# Altium footprint library PCB SMD.PcbLib: 79 footprints (part 3 of 5)
Each footprint in its own frame and in the unit in brackets; x right, y up, seen from the top. Pads: shape width x height; smd on the part's side, far side on the other; paste and mask are expansions set on the pad; w line width, h text height; cw(c..) or ccw(c..) is an arc to the next point about the centre after c.
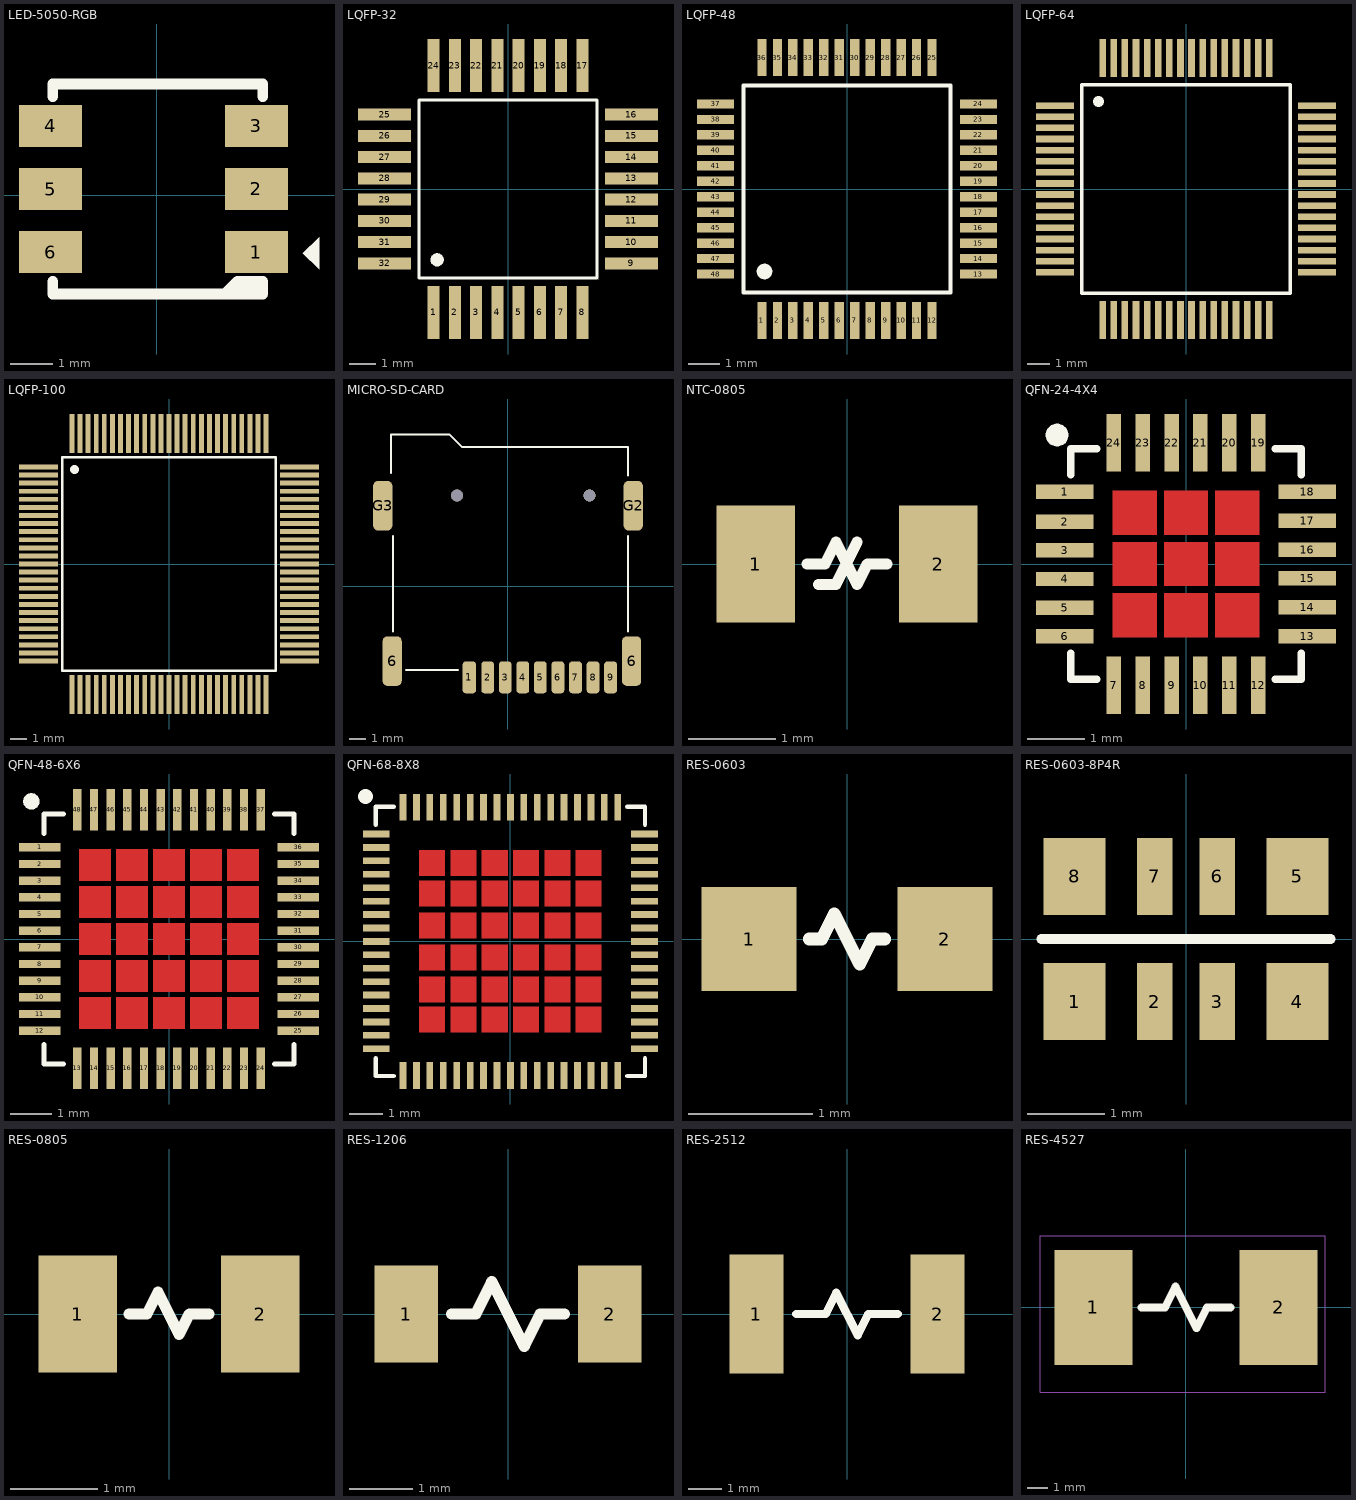
[diagram p2: the footprints below, top view; thin cyan lines are the x and y axes]

## LED-5050-RGB [mm]
pads (6):
  rect 1.5x1 smd: 1(2.374,-1.348) 2(2.374,0.152) 3(2.374,1.652) 4(-2.526,1.652) 5(-2.526,0.152) 6(-2.526,-1.348)
Top Overlay:
  region: 3.48,-1.372 3.861,-0.991 3.861,-1.753
  lines w0.254: -2.476,-2.048 -2.476,-2.348 2.524,-2.348 2.524,-2.048 ; -2.476,2.352 -2.476,2.652 2.524,2.652 2.524,2.352 ; 1.624,-2.348 1.924,-2.048 2.524,-2.048 ; 2.524,-2.048 2.224,-2.048 1.924,-2.348 2.224,-2.348 2.524,-2.048
3D body "User Library-smd_led_5050.STEP": height 1.6, standoff 0, extent -2.582,-2.348 2.718,2.652

## LQFP-32 [mm]
pads (33):
  rect 0.45x2 smd: 1(-2.8,-4.65) 2(-2,-4.65) 3(-1.2,-4.65) 4(-0.4,-4.65) 5(0.4,-4.65) 6(1.2,-4.65) 7(2,-4.65) 8(2.8,-4.65) 17(2.8,4.65) 18(2,4.65) 19(1.2,4.65) 20(0.4,4.65) 21(-0.4,4.65) 22(-1.2,4.65) 23(-2,4.65) 24(-2.8,4.65)
  rect 2x0.45 smd: 9(4.65,-2.8) 10(4.65,-2) 11(4.65,-1.2) 12(4.65,-0.4) 13(4.65,0.4) 14(4.65,1.2) 15(4.65,2) 16(4.65,2.8) 25(-4.65,2.8) 26(-4.65,2) 27(-4.65,1.2) 28(-4.65,0.4) 29(-4.65,-0.4) 30(-4.65,-1.2) 31(-4.65,-2) 32(-4.65,-2.8)
  round 0.508 on Top Overlay: ""(-2.671,-2.668)
Top Overlay:
  lines w0.127: 3.353,-3.353 3.353,3.353 -3.353,3.353 -3.353,-3.353 3.353,-3.353 ; 3.353,-3.353 3.353,-3.353
3D body "User Library-lqfp32-1.step": height 1.5, standoff 0.02, extent -4.5,-4.5 4.5,4.5

## LQFP-48 [mm] "for STM8S105C6T6"
pads (49):
  rect 0.3x1.2 smd: 1(-2.75,-4.25) 2(-2.25,-4.25) 3(-1.75,-4.25) 4(-1.25,-4.25) 5(-0.75,-4.25) 6(-0.25,-4.25) 7(0.25,-4.25) 8(0.75,-4.25) 9(1.25,-4.25) 10(1.75,-4.25) 11(2.25,-4.25) 12(2.75,-4.25) 25(2.75,4.25) 26(2.25,4.25) 27(1.75,4.25) 28(1.25,4.25) 29(0.75,4.25) 30(0.25,4.25) 31(-0.25,4.25) 32(-0.75,4.25) 33(-1.25,4.25) 34(-1.75,4.25) 35(-2.25,4.25) 36(-2.75,4.25)
  rect 1.2x0.3 smd: 13(4.25,-2.75) 14(4.25,-2.25) 15(4.25,-1.75) 16(4.25,-1.25) 17(4.25,-0.75) 18(4.25,-0.25) 19(4.25,0.25) 20(4.25,0.75) 21(4.25,1.25) 22(4.25,1.75) 23(4.25,2.25) 24(4.25,2.75) 37(-4.25,2.75) 38(-4.25,2.25) 39(-4.25,1.75) 40(-4.25,1.25) 41(-4.25,0.75) 42(-4.25,0.25) 43(-4.25,-0.25) 44(-4.25,-0.75) 45(-4.25,-1.25) 46(-4.25,-1.75) 47(-4.25,-2.25) 48(-4.25,-2.75)
  round 0.508 on Top Overlay: ""(-2.667,-2.667)
Top Overlay:
  lines w0.127: -3.353,-3.353 -3.353,3.353 3.353,3.353 3.353,-3.353 -3.353,-3.353
3D body "User Library-LQFP48-2.STEP": height 1.62, standoff -0.01, extent -4.572,-4.622 4.572,4.521

## LQFP-64 [mm]
pads (65):
  rect 1.7x0.3 smd: 1(-5.9,3.75) 2(-5.9,3.25) 3(-5.9,2.75) 4(-5.9,2.25) 5(-5.9,1.75) 6(-5.9,1.25) 7(-5.9,0.75) 8(-5.9,0.25) 9(-5.9,-0.25) 10(-5.9,-0.75) 11(-5.9,-1.25) 12(-5.9,-1.75) 13(-5.9,-2.25) 14(-5.9,-2.75) 15(-5.9,-3.25) 16(-5.9,-3.75) 33(5.9,-3.75) 34(5.9,-3.25) 35(5.9,-2.75) 36(5.9,-2.25) 37(5.9,-1.75) 38(5.9,-1.25) 39(5.9,-0.75) 40(5.9,-0.25) 41(5.9,0.25) 42(5.9,0.75) 43(5.9,1.25) 44(5.9,1.75) 45(5.9,2.25) 46(5.9,2.75) 47(5.9,3.25) 48(5.9,3.75)
  rect 0.3x1.7 smd: 17(-3.75,-5.9) 18(-3.25,-5.9) 19(-2.75,-5.9) 20(-2.25,-5.9) 21(-1.75,-5.9) 22(-1.25,-5.9) 23(-0.75,-5.9) 24(-0.25,-5.9) 25(0.25,-5.9) 26(0.75,-5.9) 27(1.25,-5.9) 28(1.75,-5.9) 29(2.25,-5.9) 30(2.75,-5.9) 31(3.25,-5.9) 32(3.75,-5.9) 49(3.75,5.9) 50(3.25,5.9) 51(2.75,5.9) 52(2.25,5.9) 53(1.75,5.9) 54(1.25,5.9) 55(0.75,5.9) 56(0.25,5.9) 57(-0.25,5.9) 58(-0.75,5.9) 59(-1.25,5.9) 60(-1.75,5.9) 61(-2.25,5.9) 62(-2.75,5.9) 63(-3.25,5.9) 64(-3.75,5.9)
  round 0.508 on Top Overlay: ""(-3.937,3.937)
Top Overlay:
  lines w0.152: -4.699,-4.699 -4.699,4.699 4.699,4.699 4.699,-4.699 -4.699,-4.699
3D body "User Library-LQFP64-1.STEP": height 1.56, standoff 0, extent -6,-6 6,6

## LQFP-100 [mm]
pads (101):
  rect 2.4x0.3 smd: 1(-8.075,6) 2(-8.075,5.5) 3(-8.075,5) 4(-8.075,4.5) 5(-8.075,4) 6(-8.075,3.5) 7(-8.075,3) 8(-8.075,2.5) 9(-8.075,2) 10(-8.075,1.5) 11(-8.075,1) 12(-8.075,0.5) 13(-8.075,0) 14(-8.075,-0.5) 15(-8.075,-1) 16(-8.075,-1.5) 17(-8.075,-2) 18(-8.075,-2.5) 19(-8.075,-3) 20(-8.075,-3.5) 21(-8.075,-4) 22(-8.075,-4.5) 23(-8.075,-5) 24(-8.075,-5.5) 25(-8.075,-6) 51(8.075,-6) 52(8.075,-5.5) 53(8.075,-5) 54(8.075,-4.5) 55(8.075,-4) 56(8.075,-3.5) 57(8.075,-3) 58(8.075,-2.5) 59(8.075,-2) 60(8.075,-1.5) 61(8.075,-1) 62(8.075,-0.5) 63(8.075,0) 64(8.075,0.5) 65(8.075,1) 66(8.075,1.5) 67(8.075,2) 68(8.075,2.5) 69(8.075,3) 70(8.075,3.5) 71(8.075,4) 72(8.075,4.5) 73(8.075,5) 74(8.075,5.5) 75(8.075,6)
  rect 0.3x2.4 smd: 26(-6,-8.075) 27(-5.5,-8.075) 28(-5,-8.075) 29(-4.5,-8.075) 30(-4,-8.075) 31(-3.5,-8.075) 32(-3,-8.075) 33(-2.5,-8.075) 34(-2,-8.075) 35(-1.5,-8.075) 36(-1,-8.075) 37(-0.5,-8.075) 38(0,-8.075) 39(0.5,-8.075) 40(1,-8.075) 41(1.5,-8.075) 42(2,-8.075) 43(2.5,-8.075) 44(3,-8.075) 45(3.5,-8.075) 46(4,-8.075) 47(4.5,-8.075) 48(5,-8.075) 49(5.5,-8.075) 50(6,-8.075) 76(6,8.075) 77(5.5,8.075) 78(5,8.075) 79(4.5,8.075) 80(4,8.075) 81(3.5,8.075) 82(3,8.075) 83(2.5,8.075) 84(2,8.075) 85(1.5,8.075) 86(1,8.075) 87(0.5,8.075) 88(0,8.075) 89(-0.5,8.075) 90(-1,8.075) 91(-1.5,8.075) 92(-2,8.075) 93(-2.5,8.075) 94(-3,8.075) 95(-3.5,8.075) 96(-4,8.075) 97(-4.5,8.075) 98(-5,8.075) 99(-5.5,8.075) 100(-6,8.075)
  round 0.559 on Top Overlay: ""(-5.842,5.842)
Top Overlay:
  lines w0.152: -6.604,-6.604 6.604,-6.604 6.604,6.604 -6.604,6.604 -6.604,-6.604
3D body "User Library-LQFP100-3.STEP": height 1.62, standoff -0.01, extent -8.072,-8.076 8.071,8.067

## MICRO-SD-CARD [mm]
pads (13):
  rrect50% 0.85x2 smd: 1(-2.423,-5.694)
  rrect50% 0.8x2 smd: 2(-1.273,-5.694) 3(-0.173,-5.694) 4(0.927,-5.694) 5(2.027,-5.694) 6(3.127,-5.694) 7(4.227,-5.694) 8(5.327,-5.694) 9(6.427,-5.694)
  rrect50% 1.2x3.1 smd: 6(-7.254,-4.679) 6(7.746,-4.679) G2(7.846,5.059) G3(-7.846,5.059)
via 5.108,5.694 diameter 0.762 hole 0.762
via -3.204,5.694 diameter 0.762 hole 0.762
Top Overlay:
  lines w0.127: -7.338,7.091 -7.338,9.504 -3.782,9.504 -3.655,9.504 -2.893,8.742 7.521,8.742 7.521,6.964 ; -7.211,-2.815 -7.211,3.154 ; -6.38,-5.228 -3.147,-5.228 ; 7.521,-2.815 7.521,3.154
3D body "User Library-MEM2055-00-190-01-A_revG.step": height 1.94, standoff -0.51, extent -8.161,-5.648 7.839,9.602

## NTC-0805 [mm]
pads (2):
  rect 0.9x1.35 smd: 1(-1.05,0) 2(1.05,0)
Top Overlay:
  lines w0.127: -0.457,0 -0.254,0 -0.127,0.254 0.117,-0.234 0.235,0.002 ; -0.33,-0.234 -0.127,-0.234 0.117,0.254 ; 0.239,0 0.457,0
3D body "RESC0805 v1.step": height 0.45, standoff 0, extent -1,-0.6 1,0.6

## QFN-24-4X4 [mm]
pads (25):
  rect 1x0.25 smd: 1(-2.1,1.25) 2(-2.1,0.73) 3(-2.1,0.235) 4(-2.1,-0.26) 5(-2.1,-0.755) 6(-2.1,-1.25) 13(2.1,-1.25) 14(2.1,-0.75) 15(2.1,-0.25) 16(2.1,0.25) 17(2.1,0.75) 18(2.1,1.25)
  rect 0.25x1 smd: 7(-1.25,-2.1) 8(-0.75,-2.1) 9(-0.25,-2.1) 10(0.25,-2.1) 11(0.75,-2.1) 12(1.25,-2.1) 19(1.25,2.1) 20(0.75,2.1) 21(0.25,2.1) 22(-0.25,2.1) 23(-0.75,2.1) 24(-1.25,2.1)
  round 0.4 on Top Overlay: ""(-2.235,2.235)
Top Layer:
  region: -1.27,1.27 -0.508,1.27 -0.508,0.508 -1.27,0.508
  region: -0.381,1.27 0.381,1.27 0.381,0.508 -0.381,0.508
  region: 0.508,1.27 1.27,1.27 1.27,0.508 0.508,0.508
  region: 0.508,0.381 1.27,0.381 1.27,-0.381 0.508,-0.381
  region: -0.381,0.381 0.381,0.381 0.381,-0.381 -0.381,-0.381
  region: -1.27,0.381 -0.508,0.381 -0.508,-0.381 -1.27,-0.381
  region: -1.27,-0.508 -0.508,-0.508 -0.508,-1.27 -1.27,-1.27
  region: -0.381,-0.508 0.381,-0.508 0.381,-1.27 -0.381,-1.27
  region: 0.508,-0.508 1.27,-0.508 1.27,-1.27 0.508,-1.27
Top Overlay:
  lines w0.127: -2,-1.549 -2,-2 -1.549,-2 ; -2,1.549 -2,2 -1.549,2 ; 1.549,-2 2,-2 2,-1.549 ; 1.549,2 2,2 2,1.549
Top Solder:
  region: -1.397,1.397 1.397,1.397 1.397,-1.397 -1.397,-1.397
3D body "User Library-QFN24.STEP": height 0.9, standoff 0, extent -2.005,-2.005 2.005,2.005

## QFN-48-6X6 [mm]
pads (49):
  rect 1x0.203 smd: 1(-3.1,2.2) 2(-3.1,1.8) 3(-3.1,1.4) 4(-3.1,1) 5(-3.1,0.6) 6(-3.1,0.2) 7(-3.1,-0.2) 8(-3.1,-0.6) 9(-3.1,-1) 10(-3.1,-1.4) 11(-3.1,-1.8) 12(-3.1,-2.2) 25(3.1,-2.2) 26(3.1,-1.8) 27(3.1,-1.4) 28(3.1,-1) 29(3.1,-0.6) 30(3.1,-0.2) 31(3.1,0.2) 32(3.1,0.6) 33(3.1,1) 34(3.1,1.4) 35(3.1,1.8) 36(3.1,2.2)
  rect 0.203x1 smd: 13(-2.2,-3.1) 14(-1.8,-3.1) 15(-1.4,-3.1) 16(-1,-3.1) 17(-0.6,-3.1) 18(-0.2,-3.1) 19(0.2,-3.1) 20(0.6,-3.1) 21(1,-3.1) 22(1.4,-3.1) 23(1.8,-3.1) 24(2.2,-3.1) 37(2.2,3.1) 38(1.8,3.1) 39(1.4,3.1) 40(1,3.1) 41(0.6,3.1) 42(0.2,3.1) 43(-0.2,3.1) 44(-0.6,3.1) 45(-1,3.1) 46(-1.4,3.1) 47(-1.8,3.1) 48(-2.2,3.1)
  round 0.4 on Top Overlay: ""(-3.302,3.302)
Top Layer:
  region: -2.159,2.159 -1.397,2.159 -1.397,1.397 -2.159,1.397
  region: -2.159,-0.508 -1.397,-0.508 -1.397,-1.27 -2.159,-1.27
  region: -2.159,0.381 -1.397,0.381 -1.397,-0.381 -2.159,-0.381
  region: -2.159,1.27 -1.397,1.27 -1.397,0.508 -2.159,0.508
  region: -2.159,-1.397 -1.397,-1.397 -1.397,-2.159 -2.159,-2.159
  region: -1.27,1.27 -0.508,1.27 -0.508,0.508 -1.27,0.508
  region: -1.27,-1.397 -0.508,-1.397 -0.508,-2.159 -1.27,-2.159
  region: -1.27,2.159 -0.508,2.159 -0.508,1.397 -1.27,1.397
  region: -1.27,-0.508 -0.508,-0.508 -0.508,-1.27 -1.27,-1.27
  region: -1.27,0.381 -0.508,0.381 -0.508,-0.381 -1.27,-0.381
  region: -0.381,1.27 0.381,1.27 0.381,0.508 -0.381,0.508
  region: -0.381,-1.397 0.381,-1.397 0.381,-2.159 -0.381,-2.159
  region: 0.508,-1.397 1.27,-1.397 1.27,-2.159 0.508,-2.159
  region: 1.397,-1.397 2.159,-1.397 2.159,-2.159 1.397,-2.159
  region: -0.381,-0.508 0.381,-0.508 0.381,-1.27 -0.381,-1.27
  region: 0.508,-0.508 1.27,-0.508 1.27,-1.27 0.508,-1.27
  region: 1.397,-0.508 2.159,-0.508 2.159,-1.27 1.397,-1.27
  region: -0.381,0.381 0.381,0.381 0.381,-0.381 -0.381,-0.381
  region: 0.508,0.381 1.27,0.381 1.27,-0.381 0.508,-0.381
  region: 1.397,0.381 2.159,0.381 2.159,-0.381 1.397,-0.381
  region: 0.508,1.27 1.27,1.27 1.27,0.508 0.508,0.508
  region: 1.397,1.27 2.159,1.27 2.159,0.508 1.397,0.508
  region: -0.381,2.159 0.381,2.159 0.381,1.397 -0.381,1.397
  region: 0.508,2.159 1.27,2.159 1.27,1.397 0.508,1.397
  region: 1.397,2.159 2.159,2.159 2.159,1.397 1.397,1.397
Top Overlay:
  lines w0.127: -3,-2.54 -3,-3 -2.54,-3 ; -3,2.54 -3,3 -2.54,3 ; 2.54,-3 3,-3 3,-2.54 ; 2.54,3 3,3 3,2.54
Top Solder:
  region: -2.286,2.286 2.286,2.286 2.286,-2.286 -2.286,-2.286
3D body "User Library-QFN48_0_4.STEP": height 0.9, standoff -0.01, extent -3,-3 3,3

## QFN-68-8X8 [mm]
pads (69):
  rect 0.8x0.2 smd: 1(-4,3.2) 2(-4,2.8) 3(-4,2.4) 4(-4,2) 5(-4,1.6) 6(-4,1.2) 7(-4,0.8) 8(-4,0.4) 9(-4,0) 10(-4,-0.4) 11(-4,-0.8) 12(-4,-1.2) 13(-4,-1.6) 14(-4,-2) 15(-4,-2.4) 16(-4,-2.8) 17(-4,-3.2) 35(4,-3.2) 36(4,-2.8) 37(4,-2.4) 38(4,-2) 39(4,-1.6) 40(4,-1.2) 41(4,-0.8) 42(4,-0.4) 43(4,0) 44(4,0.4) 45(4,0.8) 46(4,1.2) 47(4,1.6) 48(4,2) 49(4,2.4) 50(4,2.8) 51(4,3.2)
  rect 0.2x0.8 smd: 18(-3.2,-4) 19(-2.8,-4) 20(-2.4,-4) 21(-2,-4) 22(-1.6,-4) 23(-1.2,-4) 24(-0.8,-4) 25(-0.4,-4) 26(0,-4) 27(0.4,-4) 28(0.8,-4) 29(1.2,-4) 30(1.6,-4) 31(2,-4) 32(2.4,-4) 33(2.8,-4) 34(3.2,-4) 52(3.2,4) 53(2.8,4) 54(2.4,4) 55(2,4) 56(1.6,4) 57(1.2,4) 58(0.8,4) 59(0.4,4) 60(0,4) 61(-0.4,4) 62(-0.8,4) 63(-1.2,4) 64(-1.6,4) 65(-2,4) 66(-2.4,4) 67(-2.8,4) 68(-3.2,4)
  round 0.45 on Top Overlay: ""(-4.318,4.318)
Top Layer:
  region: 1.018,-1.951 1.78,-1.951 1.78,-2.713 1.018,-2.713
  region: 0.085,-1.951 0.847,-1.951 0.847,-2.713 0.085,-2.713
  region: 1.951,-1.951 2.713,-1.951 2.713,-2.713 1.951,-2.713
  region: -0.847,-1.951 -0.085,-1.951 -0.085,-2.713 -0.847,-2.713
  region: -1.78,-1.951 -1.018,-1.951 -1.018,-2.713 -1.78,-2.713
  region: -2.713,-1.951 -1.951,-1.951 -1.951,-2.713 -2.713,-2.713
  region: 1.018,-1.049 1.78,-1.049 1.78,-1.811 1.018,-1.811
  region: 0.085,-1.049 0.847,-1.049 0.847,-1.811 0.085,-1.811
  region: 1.951,-1.049 2.713,-1.049 2.713,-1.811 1.951,-1.811
  region: -0.847,-1.049 -0.085,-1.049 -0.085,-1.811 -0.847,-1.811
  region: -1.78,-1.049 -1.018,-1.049 -1.018,-1.811 -1.78,-1.811
  region: -2.713,-1.049 -1.951,-1.049 -1.951,-1.811 -2.713,-1.811
  region: 1.018,-0.096 1.78,-0.096 1.78,-0.858 1.018,-0.858
  region: 0.085,-0.096 0.847,-0.096 0.847,-0.858 0.085,-0.858
  region: 1.951,-0.096 2.713,-0.096 2.713,-0.858 1.951,-0.858
  region: -0.847,-0.096 -0.085,-0.096 -0.085,-0.858 -0.847,-0.858
  region: -1.78,-0.096 -1.018,-0.096 -1.018,-0.858 -1.78,-0.858
  region: -2.713,-0.096 -1.951,-0.096 -1.951,-0.858 -2.713,-0.858
  region: 1.018,0.857 1.78,0.857 1.78,0.095 1.018,0.095
  region: 0.085,0.857 0.847,0.857 0.847,0.095 0.085,0.095
  region: 1.951,0.857 2.713,0.857 2.713,0.095 1.951,0.095
  region: -0.847,0.857 -0.085,0.857 -0.085,0.095 -0.847,0.095
  region: -1.78,0.857 -1.018,0.857 -1.018,0.095 -1.78,0.095
  region: -2.713,0.857 -1.951,0.857 -1.951,0.095 -2.713,0.095
  region: 1.018,1.81 1.78,1.81 1.78,1.048 1.018,1.048
  region: 0.085,1.81 0.847,1.81 0.847,1.048 0.085,1.048
  region: 1.951,1.81 2.713,1.81 2.713,1.048 1.951,1.048
  region: -0.847,1.81 -0.085,1.81 -0.085,1.048 -0.847,1.048
  region: -1.78,1.81 -1.018,1.81 -1.018,1.048 -1.78,1.048
  region: -2.713,1.81 -1.951,1.81 -1.951,1.048 -2.713,1.048
  region: 1.018,2.713 1.78,2.713 1.78,1.951 1.018,1.951
  region: 0.085,2.713 0.847,2.713 0.847,1.951 0.085,1.951
  region: 1.951,2.713 2.713,2.713 2.713,1.951 1.951,1.951
  region: -0.847,2.713 -0.085,2.713 -0.085,1.951 -0.847,1.951
  region: -1.78,2.713 -1.018,2.713 -1.018,1.951 -1.78,1.951
  region: -2.713,2.713 -1.951,2.713 -1.951,1.951 -2.713,1.951
Top Overlay:
  lines w0.127: -4.013,-3.48 -4.013,-4.013 -3.48,-4.013 ; -4.013,3.48 -4.013,4.013 -3.48,4.013 ; 3.48,-4.013 4.013,-4.013 4.013,-3.48 ; 3.48,4.013 4.013,4.013 4.013,3.48
Top Solder:
  region: -2.896,2.896 2.896,2.896 2.896,-2.896 -2.896,-2.896
3D body "User Library-QFN68(8x8mm).STEP": height 0.85, standoff 0, extent -4.02,-4.02 4.02,4.02

## RES-0603 [mil]
pads (2):
  rect 30x33 smd: 1(-31,0) 2(31,0)
Top Overlay:
  lines w4: -12,0 -8,0 -4,8 4,-8 8,0 12,0
3D body "SW3dPS-0603 SMD Resistor.STEP": height 12.39, standoff 0.5, extent -31.49,-15.75 31.5,15.75

## RES-0603-8P4R [mil]
pads (8):
  rect 31.5x39.37 smd: 1(-57,-32) 4(57,-32) 5(57,32) 8(-57,32)
  rect 18x39.37 smd: 2(-16,-32) 3(16,-32) 6(16,32) 7(-16,32)
Top Overlay:
  lines w5: -74,0 74,0
3D body "User Library-resnet.STEP": height 26.09, standoff 0.5, extent -62.99,-31.5 62.99,31.5

## RES-0805 [mm]
pads (2):
  rect 0.9x1.35 smd: 1(-1.05,0) 2(1.05,0)
Top Overlay:
  lines w0.127: -0.457,0 -0.254,0 -0.127,0.254 0.117,-0.234 0.235,0.002 ; 0.239,0 0.457,0
3D body "User Library-res0805.STEP": height 0.53, standoff 0, extent -1.5,-0.7 1.5,0.7

## RES-1206 [mm]
pads (2):
  rect 1x1.524 smd: 1(-1.6,0) 2(1.6,0)
Top Overlay:
  lines w0.178: -0.889,0 -0.508,0 -0.254,0.508 0.254,-0.508 0.508,0 0.889,0
3D body "User Library-R_1206.STEP": height 0.6, standoff 0, extent -1.6,-0.8 1.6,0.8

## RES-2512 [mil]
pads (2):
  rect 63x140 smd: 1(-106.5,0) 2(106.5,0)
Top Overlay:
  lines w10: -60,0 -24.93,0 -12.47,24.93 12.47,-24.93 24.93,0 60,0
3D body "User Library-res2512_body.step": height 24.44, standoff 0, extent -124.39,-63 124.39,63

## RES-4527 [mm]
pads (2):
  rect 3.81x5.588 smd: 1(-4.5,0) 2(4.5,0)
Top Overlay:
  lines w0.381: -2.159,0 -1.016,0 -0.508,1.016 0.508,-1.016 1.016,0 2.159,0
Mechanical 20:
  lines w0.05: -7.087,-4.123 -7.087,3.485 6.763,3.485 6.763,-4.123 -7.087,-4.123
3D body "User Library-4527.step": height 2.1, standoff -0.25, extent -5.73,-3.5 5.745,3.5